# Altium footprint library Integrated_Circuit.PcbLib: 85 footprints (part 1 of 6)
Each footprint in its own frame and in the unit in brackets; x right, y up, seen from the top. Pads: shape width x height; smd on the part's side, far side on the other; paste and mask are expansions set on the pad; w line width, h text height; cw(c..) or ccw(c..) is an arc to the next point about the centre after c.
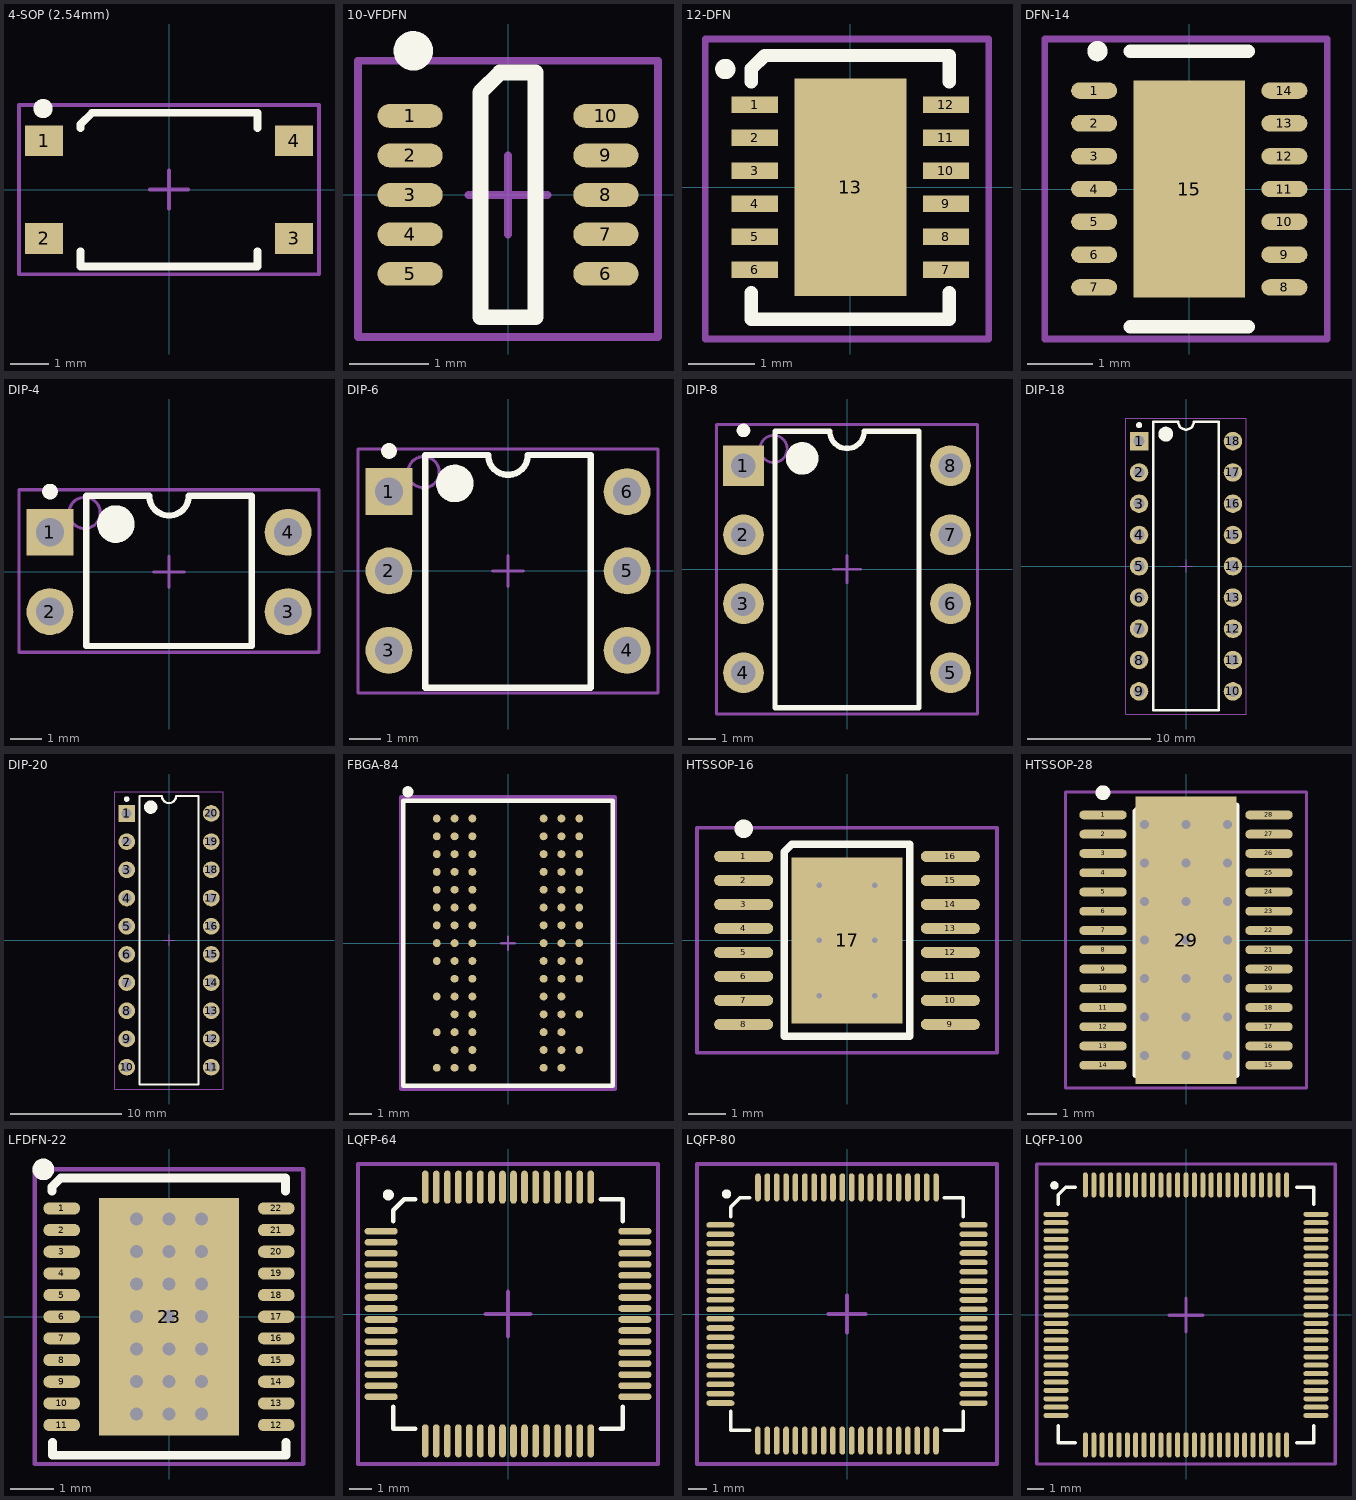
[diagram p0: the footprints below, top view; thin cyan lines are the x and y axes]

## 4-SOP (2.54mm) [mm] "Phorocoupler LTV-356T"
height 2.54
pads (4):
  rect 1x0.8 smd: 1(-3.25,1.27) 2(-3.25,-1.27) 3(3.25,-1.27) 4(3.25,1.27)
Top Overlay:
  circle w0.25: c-3.275,2.105 r0.125
  lines w0.2: -2.3,-1.6 -2.3,-2 2.3,-2 2.3,-1.6 ; -2.3,1.6 -2.3,1.7 -2,2 2.3,2 2.3,1.6
Mechanical 15:
  lines w0.1: -0.5,0 0.5,0 ; 0,-0.5 0,0.5 ; -3.9,-2.2 3.9,-2.2 3.9,2.2 -3.9,2.2 -3.9,-2.2
3D body "User Library-LTV-356T.STEP": height 2.09, standoff -0.01, extent -3.5,-1.925 3.5,1.925

## 10-VFDFN [mm] "10 Lead DFN"
height 1
pads (10):
  oval 0.825x0.3 smd: 1(-1.24,1) 2(-1.24,0.5) 3(-1.24,0) 4(-1.24,-0.5) 5(-1.24,-1) 6(1.24,-1) 7(1.24,-0.5) 8(1.24,0) 9(1.24,0.5) 10(1.24,1)
Top Overlay:
  circle w0.25: c-1.2,1.825 r0.125
  lines w0.2: -0.35,-1.55 0.35,-1.55 0.35,1.55 -0.1,1.55 -0.35,1.3 -0.35,-1.55
Mechanical 15:
  lines w0.1: -0.5,0 0.5,0 ; 0,-0.5 0,0.5 ; -1.9,-1.8 1.9,-1.8 1.9,1.7 -1.9,1.7 -1.9,-1.8
3D body "DFN 10.step": height 0.8, standoff -0.05, extent -1.56,-1.55 1.56,1.55

## 12-DFN [mm] "DFN, 13 Pin, 0.5mm Pitch"
height 0.8
pads (13):
  rect 0.7x0.25 smd: 1(-1.45,1.25) 2(-1.45,0.75) 3(-1.45,0.25) 4(-1.45,-0.25) 5(-1.45,-0.75) 6(-1.45,-1.25) 7(1.45,-1.25) 8(1.45,-0.75) 9(1.45,-0.25) 10(1.45,0.25) 11(1.45,0.75) 12(1.45,1.25)
  rect 1.7x3.3 smd: 13(0,0)
Top Overlay:
  lines w0.2: -1.95,1.8 cw(c-1.897,1.794) -1.947,1.774
  lines w0.203: -1.5,-1.6 -1.5,-2 1.5,-2 1.5,-1.6 ; -1.5,1.6 -1.5,1.8 -1.3,2 1.5,2 1.5,1.6
Mechanical 15:
  lines w0.1: -2.2,-2.3 -2.2,2.25 2.1,2.25 2.1,-2.3 -2.2,-2.3

## DFN-14 [mm] "DFN, 15 Pin, 0.5mm Pitch"
height 0.8
pads (15):
  oval 0.7x0.25 smd: 1(-1.45,1.5) 2(-1.45,1) 3(-1.45,0.5) 4(-1.45,0) 5(-1.45,-0.5) 6(-1.45,-1) 7(-1.45,-1.5) 8(1.45,-1.5) 9(1.45,-1) 10(1.45,-0.5) 11(1.45,0) 12(1.45,0.5) 13(1.45,1) 14(1.45,1.5)
  rect 1.7x3.3 smd: 15(0,0)
Top Overlay:
  lines w0.2: -1.453,2.106 cw(c-1.4,2.1) -1.45,2.08
  lines w0.203: -0.9,-2.1 0.9,-2.1 ; -0.9,2.1 0.9,2.1
Mechanical 15:
  lines w0.1: -0.3,0 0.3,0 ; 0,-0.3 0,0.3 ; -2.2,-2.286 2.1,-2.286 2.1,2.286 -2.2,2.286 -2.2,-2.286
3D body "User Library-LT3479.STEP": height 0.75, standoff 0, extent -1.501,-2 1.501,2

## DIP-4 [mm] "DIP, 4-Pin, Row Spacing 7.62 mm, Pitch 2.54 mm"
height 5.08
pads (4):
  rect 1.5x1.5 hole 0.9: 1(-3.81,1.27)
  round 1.5 hole 0.9: 2(-3.81,-1.27) 3(3.81,-1.27) 4(3.81,1.27)
Top Overlay:
  circle w0.6: c-1.7,1.53 r0.3
  circle w0.25: c-3.81,2.57 r0.125
  lines w0.2: -2.65,-2.37 2.65,-2.37 2.65,2.44 0.635,2.44 cw(c0,2.44) -0.635,2.44 -2.65,2.44 -2.65,-2.37
Mechanical 15:
  circle w0.1: c-2.7,1.89 r0.5
  lines w0.1: -0.5,0 0.5,0 ; 0,-0.5 0,0.5 ; -4.8,-2.57 4.8,-2.57 4.8,2.63 -4.8,2.63 -4.8,-2.57
3D body "DIP-4.STEP": height 4.3, standoff -3, extent -3.935,-2.25 3.935,2.33

## DIP-6 [mm] "DIP, 6-Pin, Row Spacing 7.62 mm, Pitch 2.54 mm"
height 5.08
pads (6):
  rect 1.5x1.5 hole 0.9: 1(-3.81,2.54)
  round 1.5 hole 0.9: 2(-3.81,0) 3(-3.81,-2.54) 4(3.81,-2.54) 5(3.81,0) 6(3.81,2.54)
Top Overlay:
  circle w0.25: c-3.81,3.84 r0.125
  circle w0.6: c-1.7,2.8 r0.3
  lines w0.2: -2.65,-3.74 -2.65,3.71 -0.635,3.71 ccw(c0,3.71) 0.635,3.71 2.65,3.71 2.65,-3.74 -2.65,-3.74
Mechanical 15:
  circle w0.1: c-2.7,3.16 r0.5
  lines w0.1: -0.5,0 0.5,0 ; 0,-0.5 0,0.5 ; -4.8,-3.9 -4.8,3.9 4.8,3.9 4.8,-3.9 -4.8,-3.9
3D body "User Library-DIP6.STEP": height 4.3, standoff -3, extent -3.97,-3.56 3.9,3.56

## DIP-8 [mm] "DIP, 8-Pin, Row Spacing 7.62 mm, Pitch 2.54 mm"
pads (8):
  rect 1.5x1.5 hole 0.9: 1(-3.81,3.81)
  round 1.5 hole 0.9: 2(-3.81,1.27) 3(-3.81,-1.27) 4(-3.81,-3.81) 5(3.81,-3.81) 6(3.81,-1.27) 7(3.81,1.27) 8(3.81,3.81)
Top Overlay:
  circle w0.6: c-1.65,4.08 r0.3
  circle w0.25: c-3.81,5.11 r0.125
  lines w0.2: -2.65,-5.1 2.65,-5.1 2.65,5.08 0.635,5.08 cw(c0,5.08) -0.635,5.08 -2.65,5.08 -2.65,-5.1
Mechanical 15:
  circle w0.1: c-2.7,4.43 r0.5
  lines w0.1: -0.5,0.005 0.5,0.005 ; 0,-0.495 0,0.505 ; -4.8,-5.325 4.8,-5.325 4.8,5.33 -4.8,5.33 -4.8,-5.325
3D body "User Library-DIP08-300.SLDPRT": height 5.08, standoff -2.49, extent -3.935,-5.46 3.935,5.46

## DIP-18 [mm] "DIP, 18-Pin, Row Spacing 7.62 mm, Pitch 2.54 mm"
height 5.08
pads (18):
  rect 1.5x1.5 hole 0.9: 1(-3.81,10.16)
  round 1.5 hole 0.9: 2(-3.81,7.62) 3(-3.81,5.08) 4(-3.81,2.54) 5(-3.81,0) 6(-3.81,-2.54) 7(-3.81,-5.08) 8(-3.81,-7.62) 9(-3.81,-10.16) 10(3.81,-10.16) 11(3.81,-7.62) 12(3.81,-5.08) 13(3.81,-2.54) 14(3.81,0) 15(3.81,2.54) 16(3.81,5.08) 17(3.81,7.62) 18(3.81,10.16)
Top Overlay:
  circle w0.6: c-1.65,10.73 r0.3
  circle w0.25: c-3.81,11.46 r0.125
  lines w0.2: -2.65,-11.7 2.65,-11.7 2.65,11.73 0.635,11.73 cw(c0,11.73) -0.635,11.73 -2.65,11.73 -2.65,-11.7
Mechanical 15:
  lines w0.1: -0.5,0 0.5,0 ; 0,-0.49 0,0.51 ; -4.9,-12 4.9,-12 4.9,12 -4.9,12 -4.9,-12
3D body "User Library-DIP18-300.step": height 5.08, standoff -2.49, extent -3.935,-11.485 3.935,11.505

## DIP-20 [mm] "DIP, 20-Pin, Row Spacing 7.62 mm, Pitch 2.54 mm"
height 5.08
pads (20):
  rect 1.5x1.5 hole 0.9: 1(-3.81,11.43)
  round 1.5 hole 0.9: 2(-3.81,8.89) 3(-3.81,6.35) 4(-3.81,3.81) 5(-3.81,1.27) 6(-3.81,-1.27) 7(-3.81,-3.81) 8(-3.81,-6.35) 9(-3.81,-8.89) 10(-3.81,-11.43) 11(3.81,-11.43) 12(3.81,-8.89) 13(3.81,-6.35) 14(3.81,-3.81) 15(3.81,-1.27) 16(3.81,1.27) 17(3.81,3.81) 18(3.81,6.35) 19(3.81,8.89) 20(3.81,11.43)
Top Overlay:
  circle w0.25: c-3.81,12.73 r0.125
  circle w0.6: c-1.65,12 r0.3
  lines w0.2: -2.65,-13 -2.65,13 -0.635,13 ccw(c0,13) 0.635,13 2.65,13 2.65,-13 -2.65,-13
Mechanical 15:
  lines w0.1: -0.5,0 0.5,0 ; 0,-0.5 0,0.5 ; -4.9,-13.4 -4.9,13.4 4.9,13.4 4.9,-13.4 -4.9,-13.4
3D body "DIP-20.STEP": height 4.57, standoff -3.81, extent -3.91,-13.27 3.91,13.27

## FBGA-84 [mil]
height 47.24
pads (84):
  round 14 smd: A1(-125.98,220.47) A2(-94.49,220.47) A3(-62.99,220.47) A7(62.99,220.47) A8(94.49,220.47) A9(125.98,220.47) B1(-125.98,188.98) B2(-94.49,188.98) B3(-62.99,188.98) B7(62.99,188.98) B8(94.49,188.98) B9(125.98,188.98) C1(-125.98,157.48) C2(-94.49,157.48) C3(-62.99,157.48) C7(62.99,157.48) C8(94.49,157.48) C9(125.98,157.48) D1(-125.98,125.98) D2(-94.49,125.98) D3(-62.99,125.98) D7(62.99,125.98) D8(94.49,125.98) D9(125.98,125.98) E1(-125.98,94.49) E2(-94.49,94.49) E3(-62.99,94.49) E7(62.99,94.49) E8(94.49,94.49) E9(125.98,94.49) F1(-125.98,62.99) F2(-94.49,62.99) F3(-62.99,62.99) F7(62.99,62.99) F8(94.49,62.99) F9(125.98,62.99) G1(-125.98,31.5) G2(-94.49,31.5) G3(-62.99,31.5) G7(62.99,31.5) G8(94.49,31.5) G9(125.98,31.5) H1(-125.98,0) H2(-94.49,0) H3(-62.99,0) H7(62.99,0) H8(94.49,0) H9(125.98,0) J1(-125.98,-31.5) J2(-94.49,-31.5) J3(-62.99,-31.5) J7(62.99,-31.5) J8(94.49,-31.5) J9(125.98,-31.5) K2(-94.49,-62.99) K3(-62.99,-62.99) K7(62.99,-62.99) K8(94.49,-62.99) K9(125.98,-62.99) L1(-125.98,-94.49) L2(-94.49,-94.49) L3(-62.99,-94.49) L7(62.99,-94.49) L8(94.49,-94.49) M2(-94.49,-125.98) M3(-62.99,-125.98) M7(62.99,-125.98) M8(94.49,-125.98) M9(125.98,-125.98) N1(-125.98,-157.48) N2(-94.49,-157.48) N3(-62.99,-157.48) N7(62.99,-157.48) N8(94.49,-157.48) P2(-94.49,-188.98) P3(-62.99,-188.98) P7(62.99,-188.98) P8(94.49,-188.98) P9(125.98,-188.98) R1(-125.98,-220.47) R2(-94.49,-220.47) R3(-62.99,-220.47) R7(62.99,-220.47) R8(94.49,-220.47)
Top Overlay:
  circle w9.84: c-177.17,267.72 r4.92
  lines w7.87: -185.04,-251.97 185.04,-251.97 185.04,251.97 -185.04,251.97 -185.04,-251.97
Mechanical 15:
  lines w3.94: -11.81,0 11.81,0 ; 0,-11.81 0,11.81
  lines w7.87: -189,-258 -189,258 189,258 189,-258 -189,-258
3D body "MIC-FBGA-84-PK.step": height 47.09, standoff 0, extent -179.01,-247.99 179.02,248

## HTSSOP-16 [mm] "HTSSOP, Plastic; 16 Leads; Pitch 0.65 mm"
height 2
pads (17):
  oval 1.6x0.3 smd: 1(-2.8,2.275) 2(-2.8,1.625) 3(-2.8,0.975) 4(-2.8,0.325) 5(-2.8,-0.325) 6(-2.8,-0.975) 7(-2.8,-1.625) 8(-2.8,-2.275) 9(2.8,-2.275) 10(2.8,-1.625) 11(2.8,-0.975) 12(2.8,-0.325) 13(2.8,0.325) 14(2.8,0.975) 15(2.8,1.625) 16(2.8,2.275)
  rect 3x4.5 smd paste-0.5 mask-0.5: 17(0,0)
via 0.75,1.5 diameter 0.33 hole 0.15
via -0.75,1.5 diameter 0.33 hole 0.15
via 0.75,-1.5 diameter 0.33 hole 0.15
via -0.75,-1.5 diameter 0.33 hole 0.15
via -0.75,0 diameter 0.33 hole 0.15
via 0.75,0 diameter 0.33 hole 0.15
Top Overlay:
  circle w0.25: c-2.8,3.025 r0.125
  lines w0.2: -1.7,-2.6 1.7,-2.6 1.7,2.6 -1.5,2.6 -1.7,2.4 -1.7,-2.6
Mechanical 15:
  lines w0.1: -0.3,0 0.3,0 ; 0,-0.3 0,0.3 ; -4.064,-3.048 -4.064,3.048 4.064,3.048 4.064,-3.048 -4.064,-3.048
3D body "User Library-ssop16p500x440ls065h200.STEP": height 2, standoff 0, extent -3.2,-2.5 3.2,2.5

## HTSSOP-28 [mm] "HTSSOP, Plastic; 16 Leads; Pitch 0.65 mm"
height 2
pads (29):
  oval 1.6x0.3 smd: 1(-2.8,4.225) 2(-2.8,3.575) 3(-2.8,2.925) 4(-2.8,2.275) 5(-2.8,1.625) 6(-2.8,0.975) 7(-2.8,0.325) 8(-2.8,-0.325) 9(-2.8,-0.975) 10(-2.8,-1.625) 11(-2.8,-2.275) 12(-2.8,-2.925) 13(-2.8,-3.575) 14(-2.8,-4.225) 15(2.8,-4.225) 16(2.8,-3.575) 17(2.8,-2.925) 18(2.8,-2.275) 19(2.8,-1.625) 20(2.8,-0.975) 21(2.8,-0.325) 22(2.8,0.325) 23(2.8,0.975) 24(2.8,1.625) 25(2.8,2.275) 26(2.8,2.925) 27(2.8,3.575) 28(2.8,4.225)
  rect 3.4x9.7 smd paste-0.5 mask-0.5: 29(0,0)
via 0,0 diameter 0.5 hole 0.3
via 0,1.3 diameter 0.5 hole 0.3
via 1.4,1.3 diameter 0.5 hole 0.3
via -1.4,1.3 diameter 0.5 hole 0.3
via -1.4,2.6 diameter 0.5 hole 0.3
via 1.4,2.6 diameter 0.5 hole 0.3
via 0,2.6 diameter 0.5 hole 0.3
via -1.4,3.9 diameter 0.5 hole 0.3
via 1.4,3.9 diameter 0.5 hole 0.3
via 0,3.9 diameter 0.5 hole 0.3
via 1.4,-1.3 diameter 0.5 hole 0.3
via -1.4,-1.3 diameter 0.5 hole 0.3
via 0,-1.3 diameter 0.5 hole 0.3
via 1.4,-2.6 diameter 0.5 hole 0.3
via -1.4,-2.6 diameter 0.5 hole 0.3
via 0,-2.6 diameter 0.5 hole 0.3
via 1.4,-3.9 diameter 0.5 hole 0.3
via -1.4,-3.9 diameter 0.5 hole 0.3
via 0,-3.9 diameter 0.5 hole 0.3
via -1.4,0 diameter 0.5 hole 0.3
via 1.4,0 diameter 0.5 hole 0.3
Top Overlay:
  circle w0.25: c-2.8,4.975 r0.125
  lines w0.2: -1.7,-4.55 1.7,-4.55 1.7,4.55 -1.5,4.55 -1.7,4.35 -1.7,-4.55
Mechanical 15:
  lines w0.1: -0.3,1.95 0.3,1.95 ; 0,1.65 0,2.25 ; -4.064,-4.998 -4.064,4.998 4.064,4.998 4.064,-4.998 -4.064,-4.998
3D body "User Library-PWP (R-PDSO-G28).STEP": height 1.2, standoff 0, extent -3.31,-4.9 3.31,4.9

## LFDFN-22 [mm]
height 1
pads (23):
  oval 0.85x0.28 smd: 1(-2.475,2.5) 2(-2.475,2) 3(-2.475,1.5) 4(-2.475,1) 5(-2.475,0.5) 6(-2.475,0) 7(-2.475,-0.5) 8(-2.475,-1) 9(-2.475,-1.5) 10(-2.475,-2)
  rrect100% 0.85x0.28 smd: 11(-2.475,-2.5) 12(2.475,-2.5) 13(2.475,-2) 14(2.475,-1.5) 15(2.475,-1) 16(2.475,-0.5) 17(2.475,0) 18(2.475,0.5) 19(2.475,1) 20(2.475,1.5) 21(2.475,2) 22(2.475,2.5)
  rect 3.24x5.48 smd: 23(0,0)
via 0.75,-0.75 diameter 0.5 hole 0.3
via -0.75,-0.75 diameter 0.5 hole 0.3
via 0,-0.75 diameter 0.5 hole 0.3
via 0.75,-1.5 diameter 0.5 hole 0.3
via -0.75,-1.5 diameter 0.5 hole 0.3
via 0,-1.5 diameter 0.5 hole 0.3
via 0.75,-2.25 diameter 0.5 hole 0.3
via -0.75,-2.25 diameter 0.5 hole 0.3
via 0,-2.25 diameter 0.5 hole 0.3
via 0,2.25 diameter 0.5 hole 0.3
via 0.75,2.25 diameter 0.5 hole 0.3
via -0.75,2.25 diameter 0.5 hole 0.3
via 0,1.5 diameter 0.5 hole 0.3
via 0.75,1.5 diameter 0.5 hole 0.3
via -0.75,1.5 diameter 0.5 hole 0.3
via 0,0.75 diameter 0.5 hole 0.3
via 0.75,0.75 diameter 0.5 hole 0.3
via -0.75,0.75 diameter 0.5 hole 0.3
via -0.75,0 diameter 0.5 hole 0.3
via 0.75,0 diameter 0.5 hole 0.3
via 0,0 diameter 0.5 hole 0.3
Top Overlay:
  circle w0.25: c-2.9,3.4 r0.125
  lines w0.2: -2.7,2.9 -2.7,3 -2.5,3.2 2.69,3.2 2.69,2.9 ; -2.69,-2.9 -2.69,-3.2 2.7,-3.2 2.7,-2.9
Mechanical 15:
  lines w0.1: -0.5,0 0.5,0 ; 0,-0.5 0,0.5 ; -3.1,-3.4 -3.1,3.4 3.1,3.4 3.1,-3.4 -3.1,-3.4
3D body "LFDFN-22.STEP": height 1.55, standoff 0, extent -2.51,-3.01 2.51,3.01

## LQFP-64 [mm]
pads (64):
  oval 1.5x0.3 smd: 1(-5.75,3.75) 2(-5.75,3.25) 3(-5.75,2.75) 4(-5.75,2.25) 5(-5.75,1.75) 6(-5.75,1.25) 7(-5.75,0.75) 8(-5.75,0.25) 9(-5.75,-0.25) 10(-5.75,-0.75) 11(-5.75,-1.25) 12(-5.75,-1.75) 13(-5.75,-2.25) 14(-5.75,-2.75) 15(-5.75,-3.25) 16(-5.75,-3.75) 33(5.75,-3.75) 34(5.75,-3.25) 35(5.75,-2.75) 36(5.75,-2.25) 37(5.75,-1.75) 38(5.75,-1.25) 39(5.75,-0.75) 40(5.75,-0.25) 41(5.75,0.25) 42(5.75,0.75) 43(5.75,1.25) 44(5.75,1.75) 45(5.75,2.25) 46(5.75,2.75) 47(5.75,3.25) 48(5.75,3.75)
  oval 0.3x1.5 smd: 17(-3.75,-5.75) 18(-3.25,-5.75) 19(-2.75,-5.75) 20(-2.25,-5.75) 21(-1.75,-5.75) 22(-1.25,-5.75) 23(-0.75,-5.75) 24(-0.25,-5.75) 25(0.25,-5.75) 26(0.75,-5.75) 27(1.25,-5.75) 28(1.75,-5.75) 29(2.25,-5.75) 30(2.75,-5.75) 31(3.25,-5.75) 32(3.75,-5.75) 49(3.75,5.75) 50(3.25,5.75) 51(2.75,5.75) 52(2.25,5.75) 53(1.75,5.75) 54(1.25,5.75) 55(0.75,5.75) 56(0.25,5.75) 57(-0.25,5.75) 58(-0.75,5.75) 59(-1.25,5.75) 60(-1.75,5.75) 61(-2.25,5.75) 62(-2.75,5.75) 63(-3.25,5.75) 64(-3.75,5.75)
Top Overlay:
  circle w0.25: c-5.425,5.4 r0.125
  lines w0.2: -5.2,-4.2 -5.2,-5.2 ; -5.2,4.2 -5.2,4.7 -4.7,5.2 -4.2,5.2 ; -4.2,-5.2 -5.2,-5.2 ; 4.2,-5.2 5.201,-5.2 5.2,-5.201 5.2,-4.2 ; 4.2,5.2 5.2,5.2 5.2,5.2 5.2,4.2 ; -5.2,-5.2 -5.2,-5.2
Mechanical 15:
  lines w0.2: -1,0 1,0 ; 0,-1 0,1 ; -6.8,-6.8 6.8,-6.8 6.8,6.8 -6.8,6.8 -6.8,-6.8
3D body "User Library-LQFP64_Grid_0_5.STEP": height 1.6, standoff 0, extent -6,-6 6,6

## LQFP-80 [mm]
pads (80):
  oval 1.5x0.3 smd: 1(-6.75,4.75) 2(-6.75,4.25) 3(-6.75,3.75) 4(-6.75,3.25) 5(-6.75,2.75) 6(-6.75,2.25) 7(-6.75,1.75) 8(-6.75,1.25) 9(-6.75,0.75) 10(-6.75,0.25) 11(-6.75,-0.25) 12(-6.75,-0.75) 13(-6.75,-1.25) 14(-6.75,-1.75) 15(-6.75,-2.25) 16(-6.75,-2.75) 17(-6.75,-3.25) 18(-6.75,-3.75) 19(-6.75,-4.25) 20(-6.75,-4.75) 41(6.75,-4.75) 42(6.75,-4.25) 43(6.75,-3.75) 44(6.75,-3.25) 45(6.75,-2.75) 46(6.75,-2.25) 47(6.75,-1.75) 48(6.75,-1.25) 49(6.75,-0.75) 50(6.75,-0.25) 51(6.75,0.25) 52(6.75,0.75) 53(6.75,1.25) 54(6.75,1.75) 55(6.75,2.25) 56(6.75,2.75) 57(6.75,3.25) 58(6.75,3.75) 59(6.75,4.25) 60(6.75,4.75)
  oval 0.3x1.5 smd: 21(-4.75,-6.75) 22(-4.25,-6.75) 23(-3.75,-6.75) 24(-3.25,-6.75) 25(-2.75,-6.75) 26(-2.25,-6.75) 27(-1.75,-6.75) 28(-1.25,-6.75) 29(-0.75,-6.75) 30(-0.25,-6.75) 31(0.25,-6.75) 32(0.75,-6.75) 33(1.25,-6.75) 34(1.75,-6.75) 35(2.25,-6.75) 36(2.75,-6.75) 37(3.25,-6.75) 38(3.75,-6.75) 39(4.25,-6.75) 40(4.75,-6.75) 61(4.75,6.75) 62(4.25,6.75) 63(3.75,6.75) 64(3.25,6.75) 65(2.75,6.75) 66(2.25,6.75) 67(1.75,6.75) 68(1.25,6.75) 69(0.75,6.75) 70(0.25,6.75) 71(-0.25,6.75) 72(-0.75,6.75) 73(-1.25,6.75) 74(-1.75,6.75) 75(-2.25,6.75) 76(-2.75,6.75) 77(-3.25,6.75) 78(-3.75,6.75) 79(-4.25,6.75) 80(-4.75,6.75)
Top Overlay:
  circle w0.25: c-6.425,6.4 r0.125
  lines w0.2: -6.2,-5.2 -6.2,-6.2 ; -6.2,5.2 -6.2,5.7 -5.7,6.2 -5.2,6.2 ; -5.2,-6.2 -6.2,-6.2 ; 5.2,6.2 6.2,6.2 ; 5.2,-6.2 6.201,-6.2 ; 6.2,-5.2 6.2,-6.201 ; 6.2,5.2 6.2,6.2 ; -6.2,-6.2 -6.2,-6.2 ; 6.2,-6.201 6.201,-6.2 ; 6.2,6.2 6.2,6.2
Mechanical 15:
  lines w0.2: -1,0 1,0 ; 0,-1 0,1 ; -8,-8 8,-8 8,8 -8,8 -8,-8
3D body "LQFP80.STEP": height 1.64, standoff 0, extent -7.1,-7.1 7.1,7.1

## LQFP-100 [mm]
pads (100):
  oval 1.5x0.3 smd: 1(-7.75,6) 2(-7.75,5.5) 3(-7.75,5) 4(-7.75,4.5) 5(-7.75,4) 6(-7.75,3.5) 7(-7.75,3) 8(-7.75,2.5) 9(-7.75,2) 10(-7.75,1.5) 11(-7.75,1) 12(-7.75,0.5) 13(-7.75,0) 14(-7.75,-0.5) 15(-7.75,-1) 16(-7.75,-1.5) 17(-7.75,-2) 18(-7.75,-2.5) 19(-7.75,-3) 20(-7.75,-3.5) 21(-7.75,-4) 22(-7.75,-4.5) 23(-7.75,-5) 24(-7.75,-5.5) 25(-7.75,-6) 51(7.75,-6) 52(7.75,-5.5) 53(7.75,-5) 54(7.75,-4.5) 55(7.75,-4) 56(7.75,-3.5) 57(7.75,-3) 58(7.75,-2.5) 59(7.75,-2) 60(7.75,-1.5) 61(7.75,-1) 62(7.75,-0.5) 63(7.75,0) 64(7.75,0.5) 65(7.75,1) 66(7.75,1.5) 67(7.75,2) 68(7.75,2.5) 69(7.75,3) 70(7.75,3.5) 71(7.75,4) 72(7.75,4.5) 73(7.75,5) 74(7.75,5.5) 75(7.75,6)
  oval 0.3x1.5 smd: 26(-6,-7.75) 27(-5.5,-7.75) 28(-5,-7.75) 29(-4.5,-7.75) 30(-4,-7.75) 31(-3.5,-7.75) 32(-3,-7.75) 33(-2.5,-7.75) 34(-2,-7.75) 35(-1.5,-7.75) 36(-1,-7.75) 37(-0.5,-7.75) 38(0,-7.75) 39(0.5,-7.75) 40(1,-7.75) 41(1.5,-7.75) 42(2,-7.75) 43(2.5,-7.75) 44(3,-7.75) 45(3.5,-7.75) 46(4,-7.75) 47(4.5,-7.75) 48(5,-7.75) 49(5.5,-7.75) 50(6,-7.75) 76(6,7.75) 77(5.5,7.75) 78(5,7.75) 79(4.5,7.75) 80(4,7.75) 81(3.5,7.75) 82(3,7.75) 83(2.5,7.75) 84(2,7.75) 85(1.5,7.75) 86(1,7.75) 87(0.5,7.75) 88(0,7.75) 89(-0.5,7.75) 90(-1,7.75) 91(-1.5,7.75) 92(-2,7.75) 93(-2.5,7.75) 94(-3,7.75) 95(-3.5,7.75) 96(-4,7.75) 97(-4.5,7.75) 98(-5,7.75) 99(-5.5,7.75) 100(-6,7.75)
Top Overlay:
  circle w0.25: c-7.849,7.722 r0.125
  lines w0.2: -7.62,-6.604 -7.62,-7.62 -6.604,-7.62 ; -7.62,6.604 -7.62,7.163 -7.163,7.62 -6.604,7.62 ; 6.604,-7.62 7.62,-7.62 7.62,-6.604 ; 6.604,7.62 7.62,7.62 7.62,6.604
Mechanical 15:
  lines w0.2: -1,-0.016 1,-0.016 ; 0,-1.016 0,0.984 ; -8.89,-8.89 -8.89,9 8.89,9 8.89,-8.89 -8.89,-8.89
3D body "User Library-LQFP-100-1.STEP": height 1.16, standoff 0.04, extent -8.001,-8.001 8.001,8